# Altium footprint library 模块.PcbLib: 12 footprints
Each footprint in its own frame and in the unit in brackets; x right, y up, seen from the top. Pads: shape width x height; smd on the part's side, far side on the other; paste and mask are expansions set on the pad; w line width, h text height; cw(c..) or ccw(c..) is an arc to the next point about the centre after c.
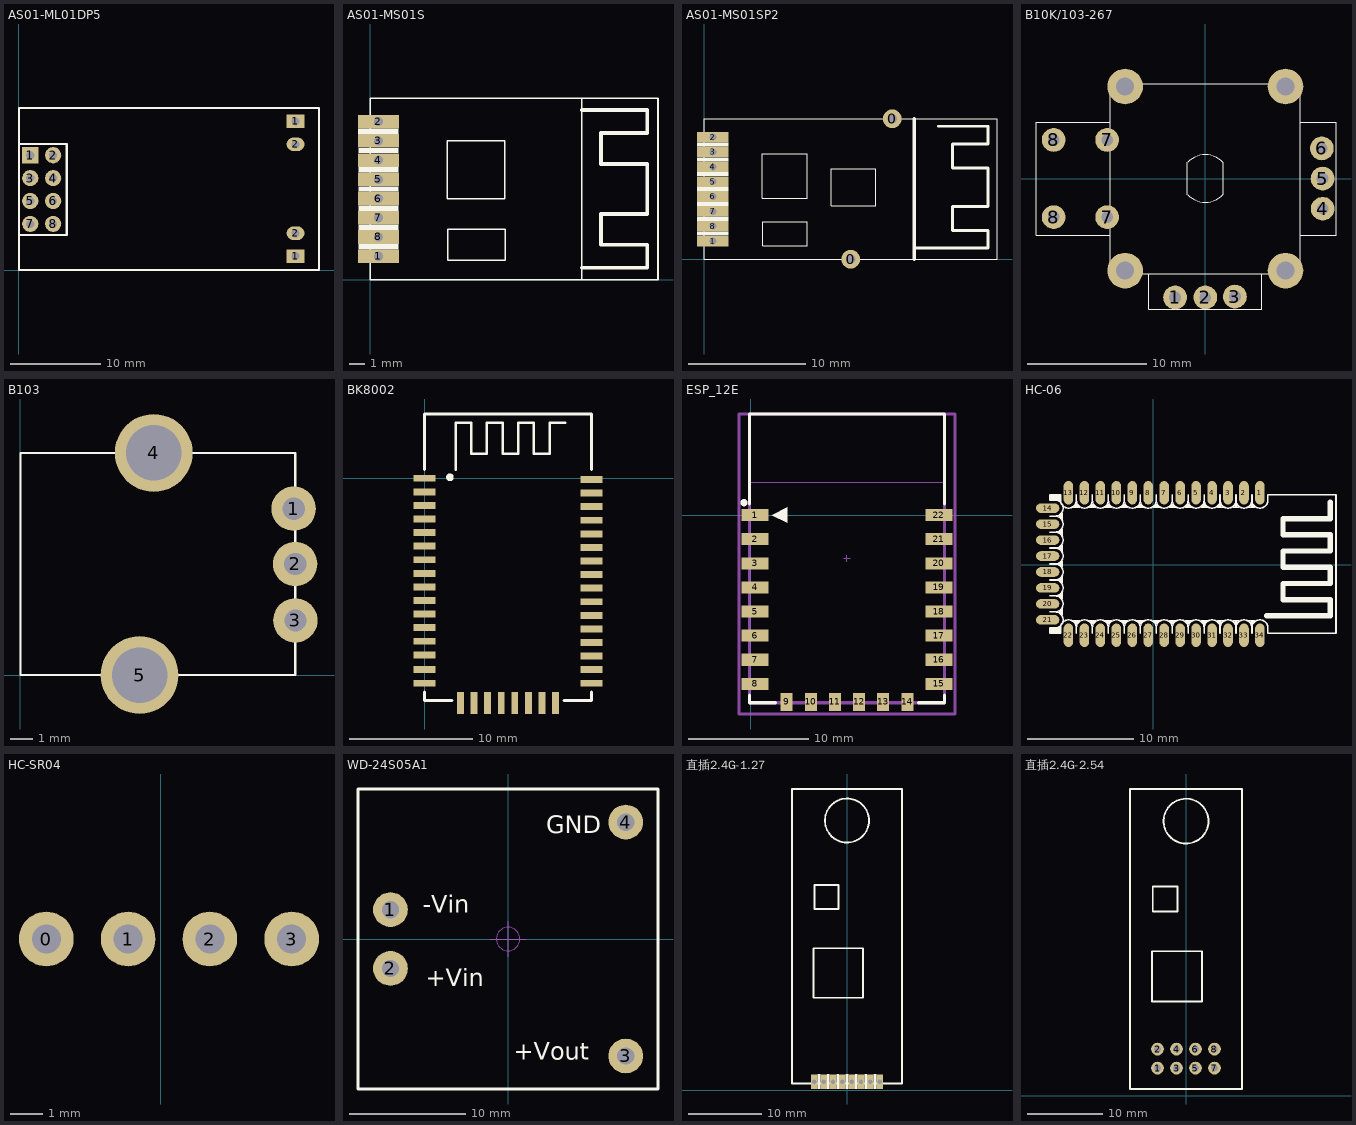
[diagram p0: the footprints below, top view; thin cyan lines are the x and y axes]

## AS01-ML01DP5 [mm] "成都泽耀科技2.4G无线收发模块"
pads (12):
  rect 1.8x1.8 hole 0.9: 1(1.3,12.75)
  rect 2x1.5 hole 0.9: 1(30.75,1.55) 1(30.75,16.5)
  round 1.8 hole 0.9: 2(3.84,12.75) 3(1.3,10.21) 4(3.84,10.21) 5(1.3,7.67) 6(3.84,7.67) 7(1.3,5.13) 8(3.84,5.13)
  oval 2x1.5 hole 0.9: 2(30.75,4.09) 2(30.75,13.96)
Top Overlay:
  lines w0.254: 0.2,3.9 5.35,3.9 ; 0.25,14 5.35,14 ; 5.35,3.95 5.35,13.95 ; 0.05,0 0.05,18 33.35,18 33.35,0 0.05,0

## AS01-MS01S [mm] "成都泽耀科技2.4G无线收发模块"
pads (8):
  rect 2.7x0.9 hole 0.6: 1(0.533,1.567) 2(0.533,10.457) 3(0.533,9.187) 4(0.533,7.917) 5(0.533,6.647) 6(0.533,5.377) 7(0.533,4.107) 8(0.533,2.837)
Top Overlay:
  region: 1.87,9.647 1.87,9.997 -0.8,9.997 -0.8,9.647
  region: 1.87,8.377 1.87,8.727 -0.8,8.727 -0.8,8.377
  region: 1.87,7.107 1.87,7.457 -0.8,7.457 -0.8,7.107
  region: 1.87,5.837 1.87,6.187 -0.8,6.187 -0.8,5.837
  region: 1.87,4.567 1.87,4.917 -0.8,4.917 -0.8,4.567
  region: 1.87,3.297 1.87,3.647 -0.8,3.647 -0.8,3.297
  region: 1.87,2.027 1.87,2.377 -0.8,2.377 -0.8,2.027
  lines w0.1: 13.97,0.007 13.97,12.007 ; 0,0.007 0,12.007 19,12.007 19,0.007 0,0.007 ; 5.08,5.377 8.89,5.377 8.89,9.187 5.08,9.187 5.08,5.377 ; 5.105,1.313 5.105,3.345 8.915,3.345 8.915,1.313 5.105,1.313
  lines w0.254: 13.97,0.805 18.288,0.805 18.288,2.329 15.24,2.329 15.24,4.361 18.288,4.361 18.288,7.663 15.24,7.663 15.24,9.695 18.288,9.695 18.288,11.219 13.97,11.219
Bottom Overlay:
  region: 1.87,9.647 1.87,9.997 -0.8,9.997 -0.8,9.647
  region: 1.87,8.377 1.87,8.727 -0.8,8.727 -0.8,8.377
  region: 1.87,7.107 1.87,7.457 -0.8,7.457 -0.8,7.107
  region: 1.87,5.837 1.87,6.187 -0.8,6.187 -0.8,5.837
  region: 1.87,4.567 1.87,4.917 -0.8,4.917 -0.8,4.567
  region: 1.87,3.297 1.87,3.647 -0.8,3.647 -0.8,3.297
  region: 1.87,2.027 1.87,2.377 -0.8,2.377 -0.8,2.027

## AS01-MS01SP2 [mm] "成都泽耀科技2.4G无线收发模块"
pads (10):
  round 1.6 hole 0.8: 0(12.497,0) 0(16.047,12)
  rect 2.7x0.9 hole 0.6: 1(0.713,1.55) 2(0.713,10.44) 3(0.713,9.17) 4(0.713,7.9) 5(0.713,6.63) 6(0.713,5.36) 7(0.713,4.09) 8(0.713,2.82)
Top Overlay:
  region: -0.623,9.98 -0.623,9.63 2.047,9.63 2.047,9.98
  region: -0.623,8.71 -0.623,8.36 2.047,8.36 2.047,8.71
  region: -0.623,7.44 -0.623,7.09 2.047,7.09 2.047,7.44
  region: -0.623,6.17 -0.623,5.82 2.047,5.82 2.047,6.17
  region: -0.623,4.9 -0.623,4.55 2.047,4.55 2.047,4.9
  region: -0.623,3.63 -0.623,3.28 2.047,3.28 2.047,3.63
  region: -0.623,2.36 -0.623,2.01 2.047,2.01 2.047,2.36
  lines w0.1: -0.003,0 -0.003,12 24.997,12 24.997,0 -0.003,0 ; 4.953,5.215 8.763,5.215 8.763,9.025 4.953,9.025 4.953,5.215 ; 4.978,1.151 4.978,3.183 8.788,3.183 8.788,1.151 4.978,1.151 ; 10.834,4.58 10.834,7.73 14.644,7.73 14.644,4.58 10.834,4.58
  lines w0.254: 17.914,0.948 24.232,0.948 24.232,2.472 21.184,2.472 21.184,4.504 24.232,4.504 24.232,7.806 21.184,7.806 21.184,9.838 24.232,9.838 24.232,11.362 19.99,11.362
  lines w0.3: 17.914,0 17.914,12
Bottom Overlay:
  region: -0.623,9.98 -0.623,9.63 2.047,9.63 2.047,9.98
  region: -0.623,8.71 -0.623,8.36 2.047,8.36 2.047,8.71
  region: -0.623,7.44 -0.623,7.09 2.047,7.09 2.047,7.44
  region: -0.623,6.17 -0.623,5.82 2.047,5.82 2.047,6.17
  region: -0.623,4.9 -0.623,4.55 2.047,4.55 2.047,4.9
  region: -0.623,3.63 -0.623,3.28 2.047,3.28 2.047,3.63
  region: -0.623,2.36 -0.623,2.01 2.047,2.01 2.047,2.36

## B10K/103-267 [mm] "摇杆电位器带按键"
pads (14):
  round 2 hole 1: 1(-2.54,-10.007) 2(0,-9.999) 3(2.489,-9.93) 4(9.881,-2.54) 5(9.873,0) 6(9.804,2.54) 7(-8.258,-3.25) 7(-8.258,3.25) 8(-12.758,-3.25) 8(-12.758,3.25)
  round 3 hole 1.5: ""(-6.75,-7.75) ""(-6.75,7.75) ""(6.75,-7.75) ""(6.75,7.75)
Top Overlay:
  lines w0.1: -8.001,-7.999 -8.001,8 -0.001,8 ; -8,-8 0,-8 ; -8,-4.75 -14.25,-4.75 -14.25,4.75 -8,4.75 ; -4.749,-7.999 -4.749,-10.999 4.751,-10.999 4.751,-7.999 ; -1.5,-1.363 -1.5,1.363 ; -1.464,-1.363 ccw(c0,0) 1.464,-1.363 ; -1.464,1.363 cw(c0,0) 1.464,1.363 ; 0,8 8,8 8,-7.999 ; 0.001,-8 8.001,-8 ; 1.5,-1.363 1.5,1.363 ; 8,-4.75 11,-4.75 11,4.75 8,4.75
3D body "SW3dPS-alps joystick module.STEP": height 19, standoff -4.3, extent -16.051,-11.952 11.824,9.348

## B103 [mm] "10K旋钮电位器"
height 15
pads (5):
  round 2 hole 1: 1(12.296,7.489) 2(12.365,5) 3(12.373,2.46)
  round 3.5 hole 2.5: 4(6,10) 5(5.365,0)
Top Overlay:
  lines w0.1: 0,0 0,10 12.365,10 12.365,0 0,0
3D body "User Library-RV09ACF-40_RK09K1130A5R.step": height 19.9, standoff -3.9, extent -0.032,0.103 12.518,9.854

## BK8002 [mil]
pads (40):
  rect 70x22 smd: 1(0,0) 2(0,-43.31) 3(0,-86.61) 4(0,-129.92) 5(0,-173.23) 6(0,-216.54) 7(0,-259.84) 8(0,-303.15) 9(0,-346.46) 10(0,-389.76) 11(0,-433.07) 12(0,-476.38) 13(0,-519.68) 14(0,-562.99) 15(0,-610.24) 16(0,-653.54) 25(531.5,-653.54) 26(531.5,-610.24) 27(531.5,-566.93) 28(531.5,-523.62) 29(531.5,-480.31) 30(531.5,-437.01) 31(531.5,-393.7) 32(531.5,-350.39) 33(531.5,-307.09) 34(531.5,-263.78) 35(531.5,-220.47) 36(531.5,-177.17) 37(531.5,-133.86) 38(531.5,-90.55) 39(531.5,-47.24) 40(531.5,-3.94)
  rect 22x70 smd: 17(114.17,-716.54) 18(157.48,-716.54) 19(200.79,-716.54) 20(244.09,-716.54) 21(287.4,-716.54) 22(330.71,-716.54) 23(374.02,-716.54) 24(417.32,-716.54)
Top Overlay:
  circle w12: c80.76,3 r6
  lines w8: 98.43,27.56 98.43,177.56 148.43,177.56 148.43,77.56 198.43,77.56 198.43,177.56 248.43,177.56 248.43,77.56 298.43,77.56 298.43,177.56 348.43,177.56 348.43,77.56 398.43,77.56 398.43,177.56 448.43,177.56
  lines w10: 0,-681.1 0,-708.66 86.61,-708.66 ; 0,27.56 0,204.72 531.5,204.72 531.5,27.56 ; 444.88,-708.66 531.5,-708.66 531.5,-681.1
3D body "BK8002.stp": height 84.37, standoff -1.09, extent -0.78,-713.08 532.29,192.92

## ESP_12E [mm] "ESP-12 Wi-Fi Module by AI-Thinker"
height 3.2
pads (22):
  rect 2.25x1 smd: 1(0.375,0) 2(0.375,-2) 3(0.375,-4) 4(0.375,-6) 5(0.375,-8) 6(0.375,-10) 7(0.375,-12) 8(0.375,-14) 15(15.625,-14) 16(15.625,-12) 17(15.625,-10) 18(15.625,-8) 19(15.625,-6) 20(15.625,-4) 21(15.625,-2) 22(15.625,0)
  rect 1x1.5 smd: 9(3,-15.5) 10(5,-15.5) 11(7,-15.5) 12(9,-15.5) 13(11,-15.5) 14(13,-15.5)
Top Overlay:
  circle w0.3: c-0.55,1.025 r0.15
  region: 1.77,0 3.04,-0.635 3.04,0.635
  lines w0.254: -0.084,-14.916 -0.084,-15.568 2.068,-15.568 ; -0.084,0.916 -0.084,8.371 16.084,8.371 16.084,0.916 ; 13.932,-15.568 16.084,-15.568 16.084,-14.916
Mechanical 13:
  lines w0.051: -0.127,2.727 16.129,2.727 16.129,8.382 -0.127,8.382 -0.127,2.727
  lines w0.254: -0.084,-15.568 -0.084,8.371 16.084,8.371 16.084,-15.568 -0.084,-15.568
  text "ANTENNA AREA" at 0.127,7.874 h0.25
  text "CUTOUT POLYGON" at 0.127,7.366 h0.25
Mechanical 15:
  lines w0.1: 7.746,-3.598 8.254,-3.598 ; 8,-3.852 8,-3.344
  lines w0.254: -0.975,-16.5 16.975,-16.5 16.975,8.371 -0.975,8.371 -0.975,-16.5
3D body "ESP_12_E.STEP": height 2.75, standoff 0.04, extent 0.001,-15.491 16.001,8.509
3D body: height 0.25, standoff 0, extent -11.938,0 -11.938,0

## HC-06 [mm] "无线蓝牙模块2.0"
pads (34):
  oval 0.9x2.2 smd: 1(10.025,6.75) 2(8.525,6.75) 3(7.025,6.75) 4(5.525,6.75) 5(4.025,6.75) 6(2.525,6.75) 7(1.025,6.75) 8(-0.475,6.75) 9(-1.975,6.75) 10(-3.475,6.75) 11(-4.975,6.75) 12(-6.475,6.75) 13(-7.975,6.75) 22(-7.975,-6.65) 23(-6.475,-6.65) 24(-4.975,-6.65) 25(-3.475,-6.65) 26(-1.975,-6.65) 27(-0.475,-6.65) 28(1.025,-6.65) 29(2.525,-6.65) 30(4.025,-6.65) 31(5.525,-6.65) 32(7.025,-6.65) 33(8.525,-6.65) 34(10.025,-6.65)
  oval 2.2x0.9 smd: 14(-9.925,5.3) 15(-9.925,3.8) 16(-9.925,2.3) 17(-9.925,0.8) 18(-9.925,-0.7) 19(-9.925,-2.2) 20(-9.925,-3.7) 21(-9.925,-5.2)
Top Overlay:
  drawing of 195 lines, arcs and shapes, not listed
3D body "User Library-Bluetooth HC-06_.step": height 2.35, standoff 0, extent -9.738,-6.96 18.272,7.06

## HC-SR04 [mm] "超声波测距模块"
pads (4):
  round 1.7 hole 0.9: 0(-3.556,8.712) 1(-1.016,8.712) 2(1.524,8.712) 3(4.064,8.712)
3D body "Ultrosonic HC-SR04.STEP": height 20.5, standoff -4.68, extent -22.5,-9.034 22.5,9.034

## WD-24S05A1 [mm] "3W-24V转5V模块"
pads (4):
  round 3 hole 1.5: 1(-10.15,2.538) 2(-10.15,-2.542) 3(10.17,-10.102) 4(10.17,10.098)
Top Overlay:
  lines w0.254: -12.954,-12.954 -12.954,12.954 12.954,12.954 12.954,-12.954 -12.954,-12.954
  text "+Vin" at -7.112,-4.064 h1.52
  text "-Vin" at -7.366,2.286 h1.52
  text "GND" at 3.302,9.144 h1.52
  text "+Vout" at 0.508,-10.414 h1.52
Mechanical 15:
  circle w0.1: c0,0 r1.016
  lines w0.1: -1.524,0 1.524,0 ; 0,-1.524 0,1.524
3D body "WD3-24S05A1.STEP": height 8.6, standoff -3.1, extent -12.75,-12.75 12.75,12.75

## 直插2.4G-1.27 [mm] "单排1.27mm脚距"
pads (8):
  rect 0.9x2 hole 0.6: 1(-4.445,1.149) 2(-3.175,1.149) 3(-1.905,1.149) 4(-0.635,1.149) 5(0.635,1.149) 6(1.905,1.149) 7(3.175,1.149) 8(4.445,1.143)
Top Overlay:
  circle w0.254: c0,36.703 r3
  region: -3.635,2.159 -3.985,2.159 -3.985,0.152 -3.635,0.152
  region: -2.365,2.159 -2.715,2.159 -2.715,0.152 -2.365,0.152
  region: 2.715,2.159 2.365,2.159 2.365,0.152 2.715,0.152
  region: 1.445,2.159 1.095,2.159 1.095,0.152 1.445,0.152
  region: 0.175,2.159 -0.175,2.159 -0.175,0.152 0.175,0.152
  region: -1.095,2.159 -1.445,2.159 -1.445,0.152 -1.095,0.152
  region: -2.365,2.159 -2.715,2.159 -2.715,0.152 -2.365,0.152
  region: 3.985,2.153 3.635,2.153 3.635,0.146 3.985,0.146
  lines w0.254: -7.493,0.889 7.493,0.889 7.493,41 -7.493,41 -7.493,0.889 ; -4.572,12.573 -4.572,19.304 2.159,19.304 2.159,12.573 -4.572,12.573 ; -4.445,24.638 -4.445,27.94 -1.143,27.94 -1.143,24.638 -4.445,24.638
Bottom Overlay:
  region: 2.715,2.159 2.365,2.159 2.365,0.152 2.715,0.152
  region: 1.445,2.159 1.095,2.159 1.095,0.152 1.445,0.152
  region: 0.175,2.159 -0.175,2.159 -0.175,0.152 0.175,0.152
  region: -1.095,2.159 -1.445,2.159 -1.445,0.152 -1.095,0.152
  region: -2.365,2.159 -2.715,2.159 -2.715,0.152 -2.365,0.152
  region: -3.635,2.159 -3.985,2.159 -3.985,0.152 -3.635,0.152
  region: 3.985,2.153 3.635,2.153 3.635,0.146 3.985,0.146

## 直插2.4G-2.54 [mm] "4*2脚距2.54mm"
pads (8):
  round 1.7 hole 0.9: 1(-3.81,3.683) 2(-3.81,6.223) 3(-1.27,3.683) 4(-1.27,6.223) 5(1.27,3.683) 6(1.27,6.223) 7(3.81,3.683) 8(3.81,6.223)
Top Overlay:
  circle w0.254: c0,36.703 r3
  lines w0.254: -7.493,0.889 -7.493,41 7.493,41 7.493,0.889 -7.493,0.889 ; -4.572,12.573 2.159,12.573 2.159,19.304 -4.572,19.304 -4.572,12.573 ; -4.445,24.638 -1.143,24.638 -1.143,27.94 -4.445,27.94 -4.445,24.638